# Altium footprint library CAP_TH.PcbLib: 220 footprints (part 11 of 14)
Each footprint in its own frame and in the unit in brackets; x right, y up, seen from the top. Pads: shape width x height; smd on the part's side, far side on the other; paste and mask are expansions set on the pad; w line width, h text height; cw(c..) or ccw(c..) is an arc to the next point about the centre after c.
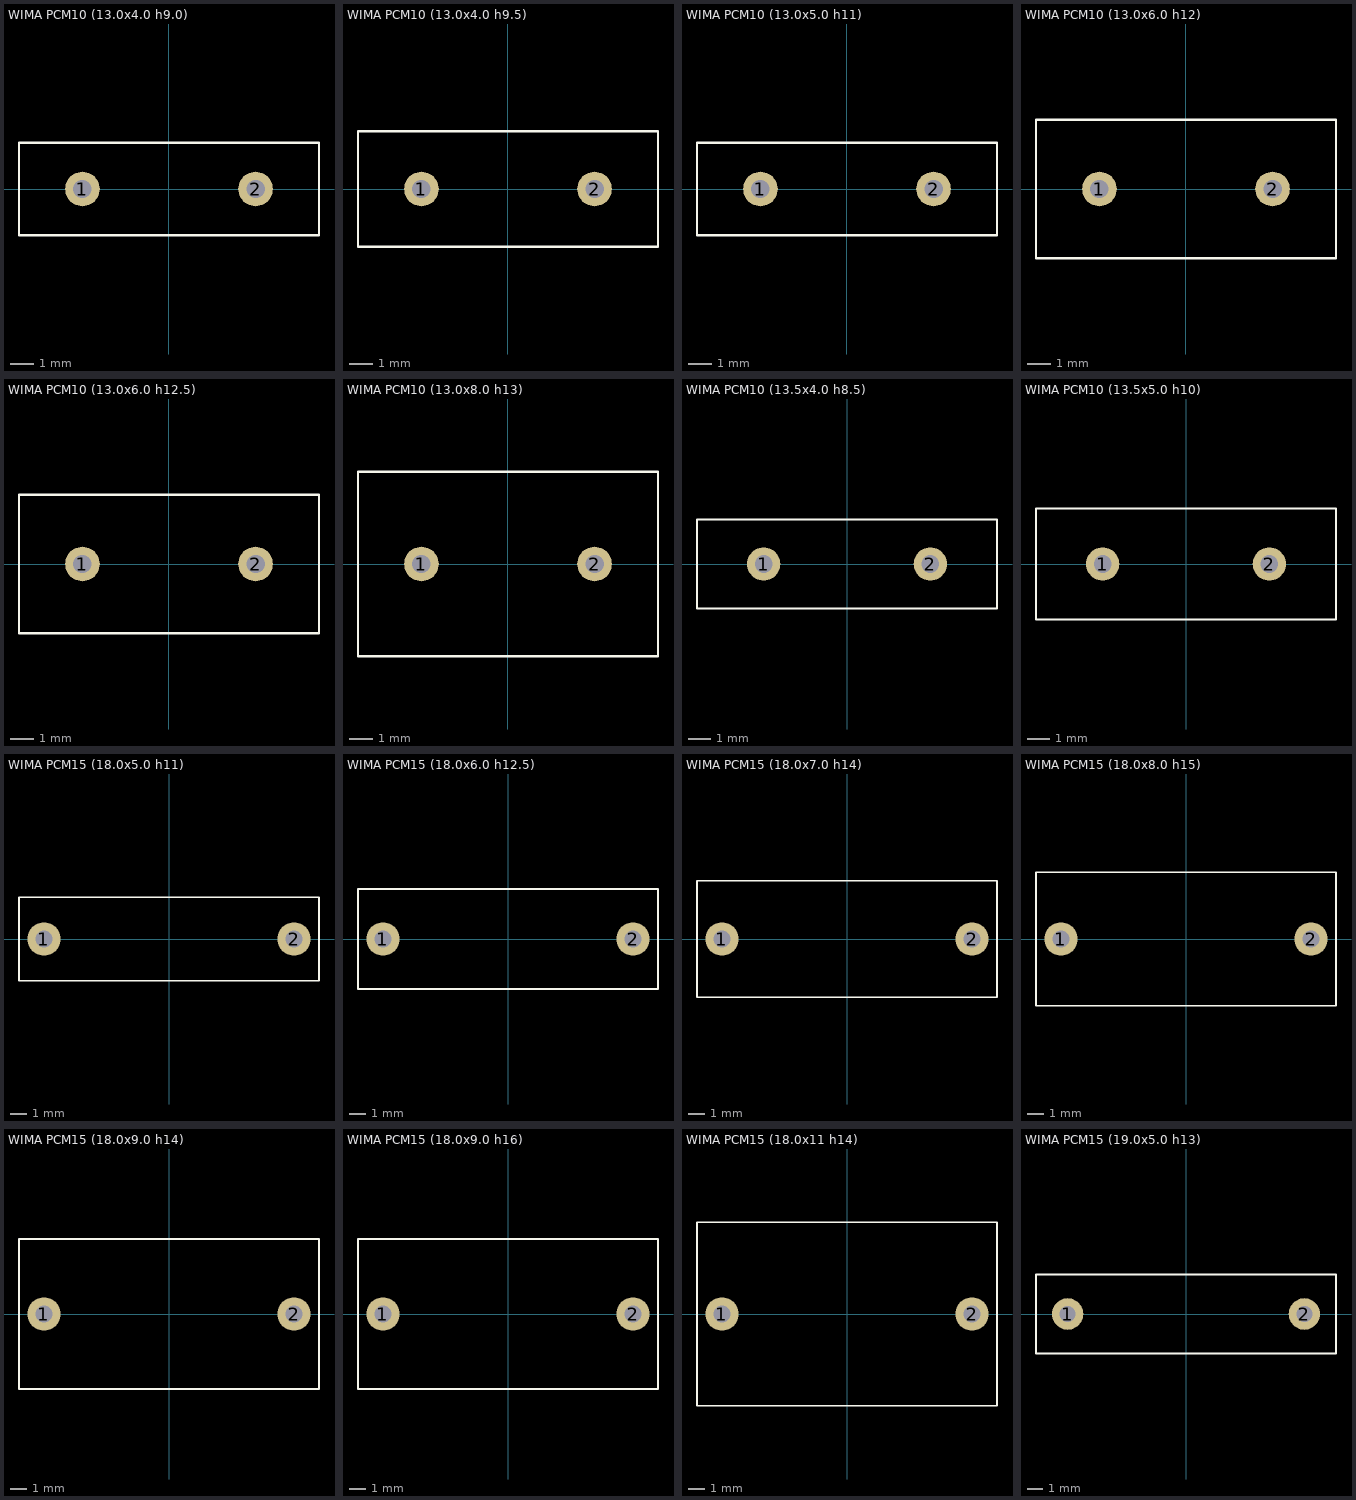
[diagram p10: the footprints below, top view; thin cyan lines are the x and y axes]

## WIMA PCM10 (13.0x4.0 h9.0) [mm]
pads (2):
  round 1.5 hole 0.8: 1(-3.75,0) 2(3.75,0)
Top Overlay:
  lines w0.1: -6.5,-2 -6.5,2 6.5,2 6.5,-2 -6.5,-2
3D body "WIMA RM10.0mm (13.0x4.0 h9.0).STEP": height 9, standoff -2, extent -6.5,-2 6.5,2

## WIMA PCM10 (13.0x4.0 h9.5) [mm]
pads (2):
  round 1.5 hole 0.8: 1(-3.75,0) 2(3.75,0)
Top Overlay:
  lines w0.1: -6.5,-2.5 6.5,-2.5 6.5,2.5 -6.5,2.5 -6.5,-2.5
3D body "WIMA PCM10 (13.0x5.0 h11).STEP": height 11, standoff -2, extent -6.5,-2.5 6.5,2.5

## WIMA PCM10 (13.0x5.0 h11) [mm]
pads (2):
  round 1.5 hole 0.8: 1(-3.75,0) 2(3.75,0)
Top Overlay:
  lines w0.1: -6.5,-2 -6.5,2 6.5,2 6.5,-2 -6.5,-2
3D body "WIMA RM10.0mm (13.0x4.0 h9.0).STEP": height 9, standoff -2, extent -6.5,-2 6.5,2

## WIMA PCM10 (13.0x6.0 h12) [mm]
pads (2):
  round 1.5 hole 0.8: 1(-3.75,0) 2(3.75,0)
Top Overlay:
  lines w0.1: -6.5,-3 6.5,-3 6.5,3 -6.5,3 -6.5,-3
3D body "WIMA PCM10 (13.0x6.0 h12).STEP": height 12, standoff -2, extent -6.5,-3 6.5,3

## WIMA PCM10 (13.0x6.0 h12.5) [mm]
pads (2):
  round 1.5 hole 0.8: 1(-3.75,0) 2(3.75,0)
Top Overlay:
  lines w0.1: -6.5,-3 6.5,-3 6.5,3 -6.5,3 -6.5,-3
3D body "WIMA PCM10 (13.0x6.0 h12.5).STEP": height 12.5, standoff -2, extent -6.5,-3 6.5,3

## WIMA PCM10 (13.0x8.0 h13) [mm]
pads (2):
  round 1.5 hole 0.8: 1(-3.75,0) 2(3.75,0)
Top Overlay:
  lines w0.1: -6.5,-4 6.5,-4 6.5,4 -6.5,4 -6.5,-4
3D body "WIMA PCM10 (13.0x8.0 h13).STEP": height 13, standoff -2, extent -6.5,-4 6.5,4

## WIMA PCM10 (13.5x4.0 h8.5) [mm]
pads (2):
  round 1.5 hole 0.8: 1(-3.75,0) 2(3.75,0)
Top Overlay:
  lines w0.1: -6.75,-2 6.75,-2 6.75,2 -6.75,2 -6.75,-2
3D body "WIMA PCM10 (13.5x4.0 h8.5).STEP": height 8.5, standoff -2, extent -6.75,-2 6.75,2

## WIMA PCM10 (13.5x5.0 h10) [mm]
pads (2):
  round 1.5 hole 0.8: 1(-3.75,0) 2(3.75,0)
Top Overlay:
  lines w0.1: -6.75,-2.5 6.75,-2.5 6.75,2.5 -6.75,2.5 -6.75,-2.5
3D body "WIMA PCM10 (13.5x5.0 h10).STEP": height 10, standoff -2, extent -6.75,-2.5 6.75,2.5

## WIMA PCM15 (18.0x5.0 h11) [mm]
pads (2):
  round 2 hole 1: 1(-7.5,0) 2(7.5,0)
Top Overlay:
  lines w0.1: -9,-2.5 9,-2.5 9,2.5 -9,2.5 -9,-2.5
3D body "WIMA PCM15 (18.0x5.0 h11).STEP": height 11, standoff -2, extent -9,-2.5 9,2.5

## WIMA PCM15 (18.0x6.0 h12.5) [mm]
pads (2):
  round 2 hole 1: 1(-7.5,0) 2(7.5,0)
Top Overlay:
  lines w0.1: -9,-3 -9,3 9,3 9,-3 -9,-3
3D body "WIMA PCM15 (18.0x6.0 h12.5).STEP": height 12.5, standoff -2, extent -9,-3 9,3

## WIMA PCM15 (18.0x7.0 h14) [mm]
pads (2):
  round 2 hole 1: 1(-7.5,0) 2(7.5,0)
Top Overlay:
  lines w0.1: -9,-3.5 -9,3.5 9,3.5 9,-3.5 -9,-3.5
3D body "WIMA PCM15 (18.0x7.0 h14).STEP": height 14, standoff -2, extent -9,-3.5 9,3.5

## WIMA PCM15 (18.0x8.0 h15) [mm]
pads (2):
  round 2 hole 1: 1(-7.5,0) 2(7.5,0)
Top Overlay:
  lines w0.1: -9,-4 9,-4 9,4 -9,4 -9,-4
3D body "WIMA PCM15 (18.0x8.0 h15).STEP": height 15, standoff -2, extent -9,-4 9,4

## WIMA PCM15 (18.0x9.0 h14) [mm]
pads (2):
  round 2 hole 1: 1(-7.5,0) 2(7.5,0)
Top Overlay:
  lines w0.1: -9,-4.5 9,-4.5 9,4.5 -9,4.5 -9,-4.5
3D body "WIMA PCM15 (18.0x9.0 h14).STEP": height 14, standoff -2, extent -9,-4.5 9,4.5

## WIMA PCM15 (18.0x9.0 h16) [mm]
pads (2):
  round 2 hole 1: 1(-7.5,0) 2(7.5,0)
Top Overlay:
  lines w0.1: -9,-4.5 -9,4.5 9,4.5 9,-4.5 -9,-4.5
3D body "WIMA PCM15 (18.0x9.0 h16).STEP": height 16, standoff -2, extent -9,-4.5 9,4.5

## WIMA PCM15 (18.0x11 h14) [mm]
pads (2):
  round 2 hole 1: 1(-7.5,0) 2(7.5,0)
Top Overlay:
  lines w0.1: -9,-5.5 9,-5.5 9,5.5 -9,5.5 -9,-5.5
3D body "WIMA PCM15 (18.0x11 h14).STEP": height 14, standoff -2, extent -9,-5.5 9,5.5

## WIMA PCM15 (19.0x5.0 h13) [mm]
pads (2):
  round 2 hole 1: 1(-7.5,0) 2(7.5,0)
Top Overlay:
  lines w0.1: -9.5,-2.5 -9.5,2.5 9.5,2.5 9.5,-2.5 -9.5,-2.5
3D body "WIMA PCM15 (19.0x5.0 h13).STEP": height 13, standoff -2, extent -9.5,-2.5 9.5,2.5